# Altium integrated library LEMO Unipole And Multipole Type Connectors.IntLib: 1566 symbols (part 10 of 13) (continued)
## PKC.M0.8GL.NN (continued)
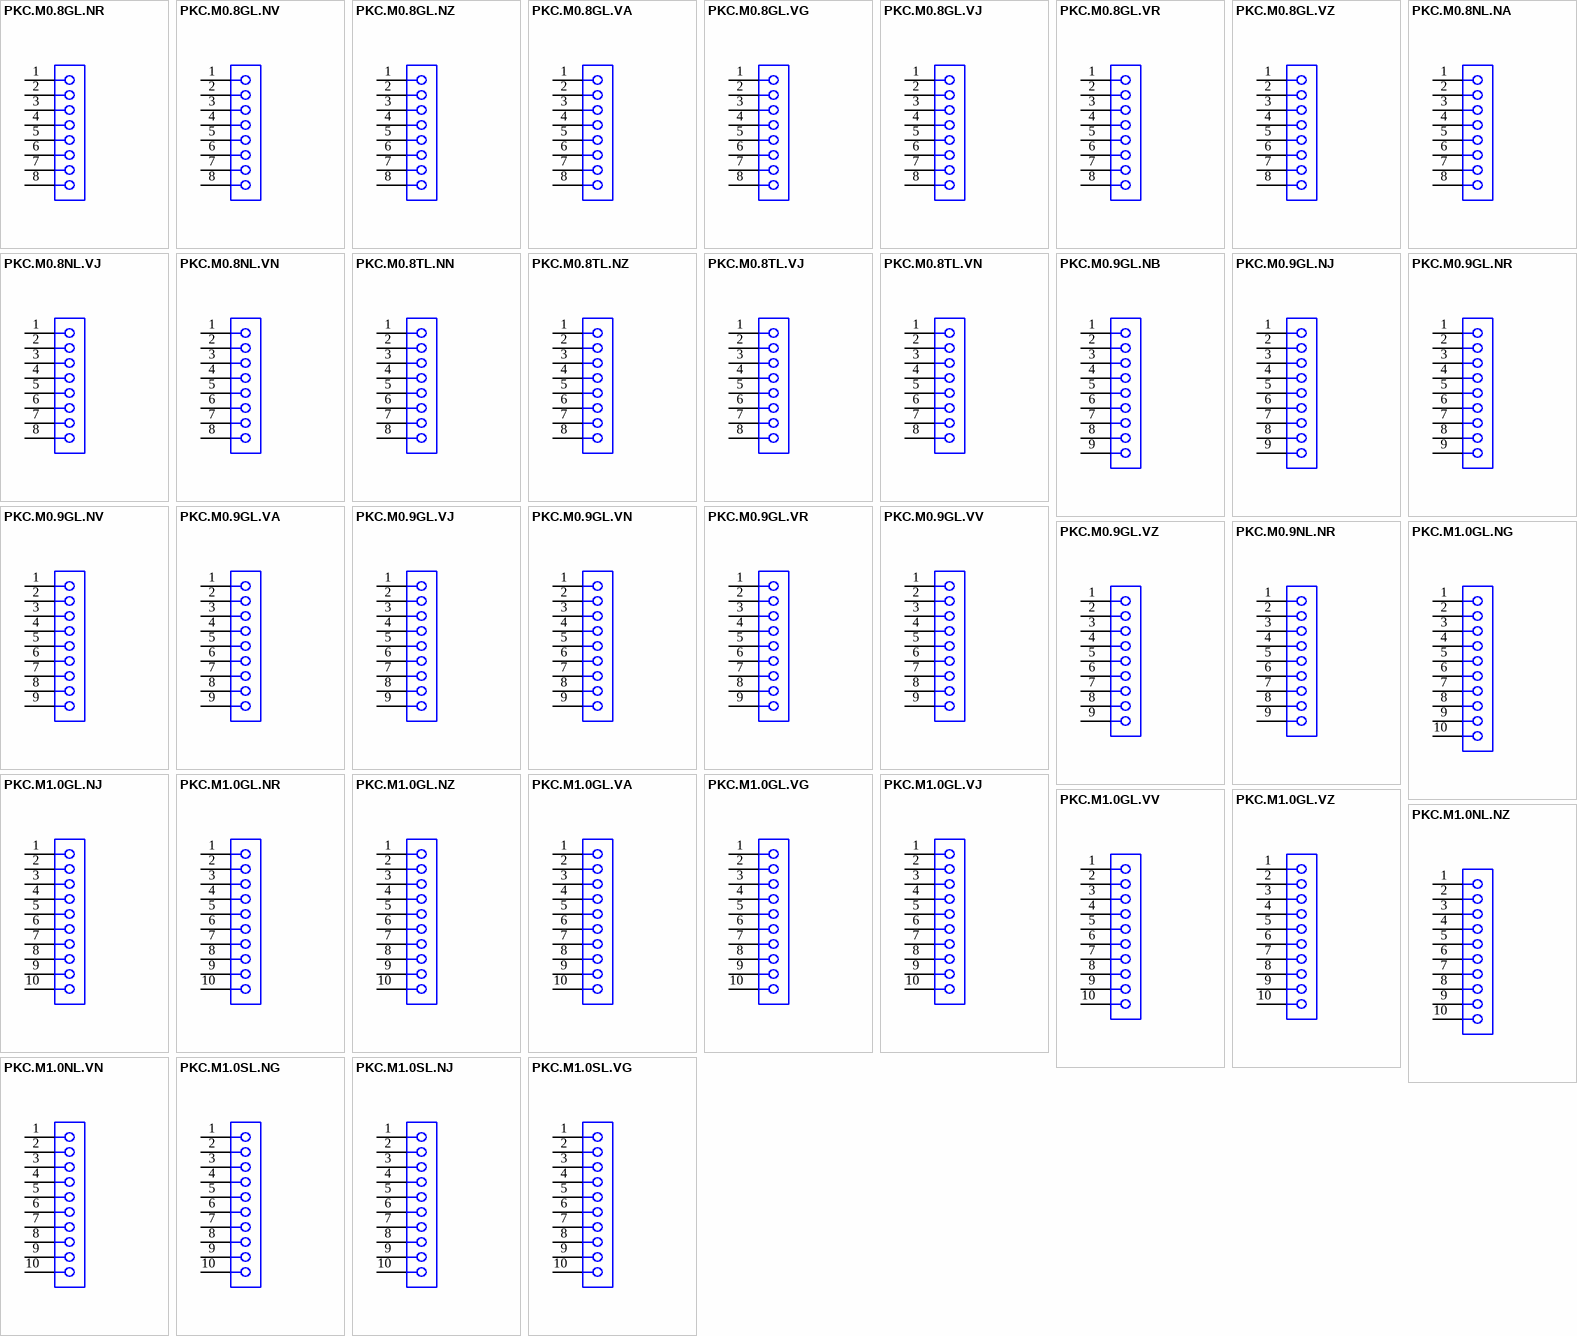
[diagram p32: symbols PKC.M0.8GL.NR to PKC.M1.0SL.VG]

## PKC.M0.8GL.NR
designator J?
Fixed receptacle with two nuts (back panel mounting), straight print contacts, Key (C), P series, Multipole Type with 8 Contacts; Manufacturer: LEMO; PartNumber: PKC.M0.8GL.NR; Number of contacts: 8; Contact Diameter: 0.7 mm; Test voltage (kV rms) Contact-Contact: 1.05; Rated Current(A): 5; DatasheetVersion: Jun-14; PackageReference: PKC.M0.8GL.NR; PackageDescription: Fixed receptacle with two nuts (back panel mounting), straight print contacts, Key(C) for Printed Circuit; ComponentLink1Description: Manufacturer URL; ComponentLink1URL: http://www.lemo.com; ComponentLink2Description: Datasheet; ComponentLink2URL: http://intra.lemo.ch/catalog/ROW/UK_English/P_series_catalog.pdf
footprint PKC.M0.8GL.NR (Socket, Female, Height 33.5 mm, Through hole)
pins: 1, 2, 3, 4, 5, 6, 7, 8

## PKC.M0.8GL.NV
designator J?
Fixed receptacle with two nuts (back panel mounting), straight print contacts, Key (C), P series, Multipole Type with 8 Contacts; Manufacturer: LEMO; PartNumber: PKC.M0.8GL.NV; Number of contacts: 8; Contact Diameter: 0.7 mm; Test voltage (kV rms) Contact-Contact: 1.05; Rated Current(A): 5; DatasheetVersion: Jun-14; PackageReference: PKC.M0.8GL.NV; PackageDescription: Fixed receptacle with two nuts (back panel mounting), straight print contacts, Key(C) for Printed Circuit; ComponentLink1Description: Manufacturer URL; ComponentLink1URL: http://www.lemo.com; ComponentLink2Description: Datasheet; ComponentLink2URL: http://intra.lemo.ch/catalog/ROW/UK_English/P_series_catalog.pdf
footprint PKC.M0.8GL.NV (Socket, Female, Height 33.5 mm, Through hole)
pins: 1, 2, 3, 4, 5, 6, 7, 8

## PKC.M0.8GL.NZ
designator J?
Fixed receptacle with 1 nut (without 2nd front nut), Key (C), P series, Multipole Type with 8 Contacts; Manufacturer: LEMO; PartNumber: PKC.M0.8GL.NZ; Number of contacts: 8; Contact Diameter: 0.7 mm; Test voltage (kV rms) Contact-Contact: 1.05; Rated Current(A): 5; DatasheetVersion: Jun-14; PackageReference: PKC.M0.8GL.NZ; PackageDescription: Fixed receptacle with 1 nut (without 2nd front nut), Key(C) for Printed Circuit; ComponentLink1Description: Manufacturer URL; ComponentLink1URL: http://www.lemo.com; ComponentLink2Description: Datasheet; ComponentLink2URL: http://intra.lemo.ch/catalog/ROW/UK_English/P_series_catalog.pdf
footprint PKC.M0.8GL.NZ (Socket, Female, Height 25 mm, Through hole)
pins: 1, 2, 3, 4, 5, 6, 7, 8

## PKC.M0.8GL.VA
designator J?
Fixed receptacle with two nuts (back panel mounting), 90° print contacts, Key (C), P series, Multipole Type with 8 Contacts; Manufacturer: LEMO; PartNumber: PKC.M0.8GL.VA; Number of contacts: 8; Contact Diameter: 0.7 mm; Test voltage (kV rms) Contact-Contact: 1.05; Rated Current(A): 5; DatasheetVersion: Jun-14; PackageReference: PKC.M0.8GL.VA; PackageDescription: Fixed receptacle with two nuts (back panel mounting), 90° print contacts, Key(C) for Printed Circuit; ComponentLink1Description: Manufacturer URL; ComponentLink1URL: http://www.lemo.com; ComponentLink2Description: Datasheet; ComponentLink2URL: http://intra.lemo.ch/catalog/ROW/UK_English/P_series_catalog.pdf
footprint PKC.M0.8GL.VA (Socket, Female, Height 33.5 mm, Through hole)
pins: 1, 2, 3, 4, 5, 6, 7, 8

## PKC.M0.8GL.VG
designator J?
Fixed receptacle with two nuts (back panel mounting), 90° print contacts, Key (C), P series, Multipole Type with 8 Contacts; Manufacturer: LEMO; PartNumber: PKC.M0.8GL.VG; Number of contacts: 8; Contact Diameter: 0.7 mm; Test voltage (kV rms) Contact-Contact: 1.05; Rated Current(A): 5; DatasheetVersion: Jun-14; PackageReference: PKC.M0.8GL.VG; PackageDescription: Fixed receptacle with two nuts (back panel mounting), 90° print contacts, Key(C) for Printed Circuit; ComponentLink1Description: Manufacturer URL; ComponentLink1URL: http://www.lemo.com; ComponentLink2Description: Datasheet; ComponentLink2URL: http://intra.lemo.ch/catalog/ROW/UK_English/P_series_catalog.pdf
footprint PKC.M0.8GL.VG (Socket, Female, Height 33.5 mm, Through hole)
pins: 1, 2, 3, 4, 5, 6, 7, 8

## PKC.M0.8GL.VJ
designator J?
Fixed receptacle with two nuts (back panel mounting), 90° print contacts, Key (C), P series, Multipole Type with 8 Contacts; Manufacturer: LEMO; PartNumber: PKC.M0.8GL.VJ; Number of contacts: 8; Contact Diameter: 0.7 mm; Test voltage (kV rms) Contact-Contact: 1.05; Rated Current(A): 5; DatasheetVersion: Jun-14; PackageReference: PKC.M0.8GL.VJ; PackageDescription: Fixed receptacle with two nuts (back panel mounting), 90° print contacts, Key(C) for Printed Circuit; ComponentLink1Description: Manufacturer URL; ComponentLink1URL: http://www.lemo.com; ComponentLink2Description: Datasheet; ComponentLink2URL: http://intra.lemo.ch/catalog/ROW/UK_English/P_series_catalog.pdf
footprint PKC.M0.8GL.VJ (Socket, Female, Height 33.5 mm, Through hole)
pins: 1, 2, 3, 4, 5, 6, 7, 8

## PKC.M0.8GL.VR
designator J?
Fixed receptacle with two nuts (back panel mounting), 90° print contacts, Key (C), P series, Multipole Type with 8 Contacts; Manufacturer: LEMO; PartNumber: PKC.M0.8GL.VR; Number of contacts: 8; Contact Diameter: 0.7 mm; Test voltage (kV rms) Contact-Contact: 1.05; Rated Current(A): 5; DatasheetVersion: Jun-14; PackageReference: PKC.M0.8GL.VR; PackageDescription: Fixed receptacle with two nuts (back panel mounting), 90° print contacts, Key(C) for Printed Circuit; ComponentLink1Description: Manufacturer URL; ComponentLink1URL: http://www.lemo.com; ComponentLink2Description: Datasheet; ComponentLink2URL: http://intra.lemo.ch/catalog/ROW/UK_English/P_series_catalog.pdf
footprint PKC.M0.8GL.VR (Socket, Female, Height 33.5 mm, Through hole)
pins: 1, 2, 3, 4, 5, 6, 7, 8

## PKC.M0.8GL.VZ
designator J?
Fixed receptacle with 1 nut (without 2nd front nut), Key (C), P series, Multipole Type with 8 Contacts; Manufacturer: LEMO; PartNumber: PKC.M0.8GL.VZ; Number of contacts: 8; Contact Diameter: 0.7 mm; Test voltage (kV rms) Contact-Contact: 1.05; Rated Current(A): 5; DatasheetVersion: Jun-14; PackageReference: PKC.M0.8GL.VZ; PackageDescription: Fixed receptacle with 1 nut (without 2nd front nut), Key(C) for Printed Circuit; ComponentLink1Description: Manufacturer URL; ComponentLink1URL: http://www.lemo.com; ComponentLink2Description: Datasheet; ComponentLink2URL: http://intra.lemo.ch/catalog/ROW/UK_English/P_series_catalog.pdf
footprint PKC.M0.8GL.VZ (Socket, Female, Height 33.5 mm, Through hole)
pins: 1, 2, 3, 4, 5, 6, 7, 8

## PKC.M0.8NL.NA
designator J?
Fixed receptacle with two nuts (back panel mounting), straight print contacts, Key (C), P series, Multipole Type with 8 Contacts; Manufacturer: LEMO; PartNumber: PKC.M0.8NL.NA; Number of contacts: 8; Contact Diameter: 0.7 mm; Test voltage (kV rms) Contact-Contact: 1.05; Rated Current(A): 5; DatasheetVersion: Jun-14; PackageReference: PKC.M0.8NL.NA; PackageDescription: Fixed receptacle with two nuts (back panel mounting), straight print contacts, Key(C) for Printed Circuit; ComponentLink1Description: Manufacturer URL; ComponentLink1URL: http://www.lemo.com; ComponentLink2Description: Datasheet; ComponentLink2URL: http://intra.lemo.ch/catalog/ROW/UK_English/P_series_catalog.pdf
footprint PKC.M0.8NL.NA (Socket, Female, Height 33.5 mm, Through hole)
pins: 1, 2, 3, 4, 5, 6, 7, 8

## PKC.M0.8NL.VJ
designator J?
Fixed receptacle with two nuts (back panel mounting), 90° print contacts, Key (C), P series, Multipole Type with 8 Contacts; Manufacturer: LEMO; PartNumber: PKC.M0.8NL.VJ; Number of contacts: 8; Contact Diameter: 0.7 mm; Test voltage (kV rms) Contact-Contact: 1.05; Rated Current(A): 5; DatasheetVersion: Jun-14; PackageReference: PKC.M0.8NL.VJ; PackageDescription: Fixed receptacle with two nuts (back panel mounting), 90° print contacts, Key(C) for Printed Circuit; ComponentLink1Description: Manufacturer URL; ComponentLink1URL: http://www.lemo.com; ComponentLink2Description: Datasheet; ComponentLink2URL: http://intra.lemo.ch/catalog/ROW/UK_English/P_series_catalog.pdf
footprint PKC.M0.8NL.VJ (Socket, Female, Height 33.5 mm, Through hole)
pins: 1, 2, 3, 4, 5, 6, 7, 8

## PKC.M0.8NL.VN
designator J?
Fixed receptacle with two nuts (back panel mounting), 90° print contacts, Key (C), P series, Multipole Type with 8 Contacts; Manufacturer: LEMO; PartNumber: PKC.M0.8NL.VN; Number of contacts: 8; Contact Diameter: 0.7 mm; Test voltage (kV rms) Contact-Contact: 1.05; Rated Current(A): 5; DatasheetVersion: Jun-14; PackageReference: PKC.M0.8NL.VN; PackageDescription: Fixed receptacle with two nuts (back panel mounting), 90° print contacts, Key(C) for Printed Circuit; ComponentLink1Description: Manufacturer URL; ComponentLink1URL: http://www.lemo.com; ComponentLink2Description: Datasheet; ComponentLink2URL: http://intra.lemo.ch/catalog/ROW/UK_English/P_series_catalog.pdf
footprint PKC.M0.8NL.VN (Socket, Female, Height 33.5 mm, Through hole)
pins: 1, 2, 3, 4, 5, 6, 7, 8

## PKC.M0.8TL.NN
designator J?
Fixed receptacle with two nuts (back panel mounting), straight print contacts, Key (C), P series, Multipole Type with 8 Contacts; Manufacturer: LEMO; PartNumber: PKC.M0.8TL.NN; Number of contacts: 8; Contact Diameter: 0.7 mm; Test voltage (kV rms) Contact-Contact: 1.05; Rated Current(A): 5; DatasheetVersion: Jun-14; PackageReference: PKC.M0.8TL.NN; PackageDescription: Fixed receptacle with two nuts (back panel mounting), straight print contacts, Key(C) for Printed Circuit; Supplier 1: Mouser; Supplier Part Number 1: 736-PKCM08TLNN; Supplier 2: Digi-Key; Supplier Part Number 2: PKC.M0.8TL.NN-ND; ComponentLink1Description: Manufacturer URL; ComponentLink1URL: http://www.lemo.com; ComponentLink2Description: Datasheet; ComponentLink2URL: http://intra.lemo.ch/catalog/ROW/UK_English/P_series_catalog.pdf
footprint PKC.M0.8TL.NN (Socket, Female, Height 33.5 mm, Through hole)
pins: 1, 2, 3, 4, 5, 6, 7, 8

## PKC.M0.8TL.NZ
designator J?
Fixed receptacle with 1 nut (without 2nd front nut), Key (C), P series, Multipole Type with 8 Contacts; Manufacturer: LEMO; PartNumber: PKC.M0.8TL.NZ; Number of contacts: 8; Contact Diameter: 0.7 mm; Test voltage (kV rms) Contact-Contact: 1.05; Rated Current(A): 5; DatasheetVersion: Jun-14; PackageReference: PKC.M0.8TL.NZ; PackageDescription: Fixed receptacle with 1 nut (without 2nd front nut), Key(C) for Printed Circuit; Supplier 1: Mouser; Supplier Part Number 1: 736-PKCM08TLNZ; Supplier 2: Digi-Key; Supplier Part Number 2: PKC.M0.8TL.NZ-ND; ComponentLink1Description: Manufacturer URL; ComponentLink1URL: http://www.lemo.com; ComponentLink2Description: Datasheet; ComponentLink2URL: http://intra.lemo.ch/catalog/ROW/UK_English/P_series_catalog.pdf
footprint PKC.M0.8TL.NZ (Socket, Female, Height 25 mm, Through hole)
pins: 1, 2, 3, 4, 5, 6, 7, 8

## PKC.M0.8TL.VJ
designator J?
Fixed receptacle with two nuts (back panel mounting), 90° print contacts, Key (C), P series, Multipole Type with 8 Contacts; Manufacturer: LEMO; PartNumber: PKC.M0.8TL.VJ; Number of contacts: 8; Contact Diameter: 0.7 mm; Test voltage (kV rms) Contact-Contact: 1.05; Rated Current(A): 5; DatasheetVersion: Jun-14; PackageReference: PKC.M0.8TL.VJ; PackageDescription: Fixed receptacle with two nuts (back panel mounting), 90° print contacts, Key(C) for Printed Circuit; Supplier 1: Mouser; Supplier Part Number 1: 736-PKCM08TLVJ; Supplier 2: Digi-Key; Supplier Part Number 2: PKC.M0.8TL.VJ-ND; ComponentLink1Description: Manufacturer URL; ComponentLink1URL: http://www.lemo.com; ComponentLink2Description: Datasheet; ComponentLink2URL: http://intra.lemo.ch/catalog/ROW/UK_English/P_series_catalog.pdf
footprint PKC.M0.8TL.VJ (Socket, Female, Height 33.5 mm, Through hole)
pins: 1, 2, 3, 4, 5, 6, 7, 8

## PKC.M0.8TL.VN
designator J?
Fixed receptacle with two nuts (back panel mounting), 90° print contacts, Key (C), P series, Multipole Type with 8 Contacts; Manufacturer: LEMO; PartNumber: PKC.M0.8TL.VN; Number of contacts: 8; Contact Diameter: 0.7 mm; Test voltage (kV rms) Contact-Contact: 1.05; Rated Current(A): 5; DatasheetVersion: Jun-14; PackageReference: PKC.M0.8TL.VN; PackageDescription: Fixed receptacle with two nuts (back panel mounting), 90° print contacts, Key(C) for Printed Circuit; Supplier 1: Mouser; Supplier Part Number 1: 736-PKCM08TLVN; Supplier 2: Digi-Key; Supplier Part Number 2: PKC.M0.8TL.VN-ND; ComponentLink1Description: Manufacturer URL; ComponentLink1URL: http://www.lemo.com; ComponentLink2Description: Datasheet; ComponentLink2URL: http://intra.lemo.ch/catalog/ROW/UK_English/P_series_catalog.pdf
footprint PKC.M0.8TL.VN (Socket, Female, Height 33.5 mm, Through hole)
pins: 1, 2, 3, 4, 5, 6, 7, 8

## PKC.M0.9GL.NB
designator J?
Fixed receptacle with two nuts (back panel mounting), straight print contacts, Key (C), P series, Multipole Type with 9 Contacts; Manufacturer: LEMO; PartNumber: PKC.M0.9GL.NB; Number of contacts: 9; Contact Diameter: 0.5 mm; Test voltage (kV rms) Contact-Contact: 0.85; Rated Current(A): 3; DatasheetVersion: Jun-14; PackageReference: PKC.M0.9GL.NB; PackageDescription: Fixed receptacle with two nuts (back panel mounting), straight print contacts, Key(C) for Printed Circuit; ComponentLink1Description: Manufacturer URL; ComponentLink1URL: http://www.lemo.com; ComponentLink2Description: Datasheet; ComponentLink2URL: http://intra.lemo.ch/catalog/ROW/UK_English/P_series_catalog.pdf
footprint PKC.M0.9GL.NB (Socket, Female, Height 33.5 mm, Through hole)
pins: 1, 2, 3, 4, 5, 6, 7, 8, 9

## PKC.M0.9GL.NJ
designator J?
Fixed receptacle with two nuts (back panel mounting), straight print contacts, Key (C), P series, Multipole Type with 9 Contacts; Manufacturer: LEMO; PartNumber: PKC.M0.9GL.NJ; Number of contacts: 9; Contact Diameter: 0.5 mm; Test voltage (kV rms) Contact-Contact: 0.85; Rated Current(A): 3; DatasheetVersion: Jun-14; PackageReference: PKC.M0.9GL.NJ; PackageDescription: Fixed receptacle with two nuts (back panel mounting), straight print contacts, Key(C) for Printed Circuit; ComponentLink1Description: Manufacturer URL; ComponentLink1URL: http://www.lemo.com; ComponentLink2Description: Datasheet; ComponentLink2URL: http://intra.lemo.ch/catalog/ROW/UK_English/P_series_catalog.pdf
footprint PKC.M0.9GL.NJ (Socket, Female, Height 33.5 mm, Through hole)
pins: 1, 2, 3, 4, 5, 6, 7, 8, 9

## PKC.M0.9GL.NR
designator J?
Fixed receptacle with two nuts (back panel mounting), straight print contacts, Key (C), P series, Multipole Type with 9 Contacts; Manufacturer: LEMO; PartNumber: PKC.M0.9GL.NR; Number of contacts: 9; Contact Diameter: 0.5 mm; Test voltage (kV rms) Contact-Contact: 0.85; Rated Current(A): 3; DatasheetVersion: Jun-14; PackageReference: PKC.M0.9GL.NR; PackageDescription: Fixed receptacle with two nuts (back panel mounting), straight print contacts, Key(C) for Printed Circuit; ComponentLink1Description: Manufacturer URL; ComponentLink1URL: http://www.lemo.com; ComponentLink2Description: Datasheet; ComponentLink2URL: http://intra.lemo.ch/catalog/ROW/UK_English/P_series_catalog.pdf
footprint PKC.M0.9GL.NR (Socket, Female, Height 33.5 mm, Through hole)
pins: 1, 2, 3, 4, 5, 6, 7, 8, 9

## PKC.M0.9GL.NV
designator J?
Fixed receptacle with two nuts (back panel mounting), straight print contacts, Key (C), P series, Multipole Type with 9 Contacts; Manufacturer: LEMO; PartNumber: PKC.M0.9GL.NV; Number of contacts: 9; Contact Diameter: 0.5 mm; Test voltage (kV rms) Contact-Contact: 0.85; Rated Current(A): 3; DatasheetVersion: Jun-14; PackageReference: PKC.M0.9GL.NV; PackageDescription: Fixed receptacle with two nuts (back panel mounting), straight print contacts, Key(C) for Printed Circuit; ComponentLink1Description: Manufacturer URL; ComponentLink1URL: http://www.lemo.com; ComponentLink2Description: Datasheet; ComponentLink2URL: http://intra.lemo.ch/catalog/ROW/UK_English/P_series_catalog.pdf
footprint PKC.M0.9GL.NV (Socket, Female, Height 33.5 mm, Through hole)
pins: 1, 2, 3, 4, 5, 6, 7, 8, 9

## PKC.M0.9GL.VA
designator J?
Fixed receptacle with two nuts (back panel mounting), 90° print contacts, Key (C), P series, Multipole Type with 9 Contacts; Manufacturer: LEMO; PartNumber: PKC.M0.9GL.VA; Number of contacts: 9; Contact Diameter: 0.5 mm; Test voltage (kV rms) Contact-Contact: 0.85; Rated Current(A): 3; DatasheetVersion: Jun-14; PackageReference: PKC.M0.9GL.VA; PackageDescription: Fixed receptacle with two nuts (back panel mounting), 90° print contacts, Key(C) for Printed Circuit; ComponentLink1Description: Manufacturer URL; ComponentLink1URL: http://www.lemo.com; ComponentLink2Description: Datasheet; ComponentLink2URL: http://intra.lemo.ch/catalog/ROW/UK_English/P_series_catalog.pdf
footprint PKC.M0.9GL.VA (Socket, Female, Height 33.5 mm, Through hole)
pins: 1, 2, 3, 4, 5, 6, 7, 8, 9

## PKC.M0.9GL.VJ
designator J?
Fixed receptacle with two nuts (back panel mounting), 90° print contacts, Key (C), P series, Multipole Type with 9 Contacts; Manufacturer: LEMO; PartNumber: PKC.M0.9GL.VJ; Number of contacts: 9; Contact Diameter: 0.5 mm; Test voltage (kV rms) Contact-Contact: 0.85; Rated Current(A): 3; DatasheetVersion: Jun-14; PackageReference: PKC.M0.9GL.VJ; PackageDescription: Fixed receptacle with two nuts (back panel mounting), 90° print contacts, Key(C) for Printed Circuit; ComponentLink1Description: Manufacturer URL; ComponentLink1URL: http://www.lemo.com; ComponentLink2Description: Datasheet; ComponentLink2URL: http://intra.lemo.ch/catalog/ROW/UK_English/P_series_catalog.pdf
footprint PKC.M0.9GL.VJ (Socket, Female, Height 33.5 mm, Through hole)
pins: 1, 2, 3, 4, 5, 6, 7, 8, 9

## PKC.M0.9GL.VN
designator J?
Fixed receptacle with two nuts (back panel mounting), 90° print contacts, Key (C), P series, Multipole Type with 9 Contacts; Manufacturer: LEMO; PartNumber: PKC.M0.9GL.VN; Number of contacts: 9; Contact Diameter: 0.5 mm; Test voltage (kV rms) Contact-Contact: 0.85; Rated Current(A): 3; DatasheetVersion: Jun-14; PackageReference: PKC.M0.9GL.VN; PackageDescription: Fixed receptacle with two nuts (back panel mounting), 90° print contacts, Key(C) for Printed Circuit; ComponentLink1Description: Manufacturer URL; ComponentLink1URL: http://www.lemo.com; ComponentLink2Description: Datasheet; ComponentLink2URL: http://intra.lemo.ch/catalog/ROW/UK_English/P_series_catalog.pdf
footprint PKC.M0.9GL.VN (Socket, Female, Height 33.5 mm, Through hole)
pins: 1, 2, 3, 4, 5, 6, 7, 8, 9

## PKC.M0.9GL.VR
designator J?
Fixed receptacle with two nuts (back panel mounting), 90° print contacts, Key (C),  series, Multipole Type with 9 Contacts; Manufacturer: LEMO; PartNumber: PKC.M0.9GL.VR; Number of contacts: 9; Contact Diameter: 0.5 mm; Test voltage (kV rms) Contact-Contact: 0.85; Rated Current(A): 3; DatasheetVersion: Jun-14; PackageReference: PKC.M0.9GL.VR; PackageDescription: Fixed receptacle with two nuts (back panel mounting), 90° print contacts, Key(C) for Printed Circuit; ComponentLink1Description: Manufacturer URL; ComponentLink1URL: http://www.lemo.com; ComponentLink2Description: Datasheet; ComponentLink2URL: http://intra.lemo.ch/catalog/ROW/UK_English/P_series_catalog.pdf
footprint PKC.M0.9GL.VR (Socket, Female, Height 33.5 mm, Through hole)
pins: 1, 2, 3, 4, 5, 6, 7, 8, 9

## PKC.M0.9GL.VV
designator J?
Fixed receptacle with two nuts (back panel mounting), 90° print contacts, Key (C), P series, Multipole Type with 9 Contacts; Manufacturer: LEMO; PartNumber: PKC.M0.9GL.VV; Number of contacts: 9; Contact Diameter: 0.5 mm; Test voltage (kV rms) Contact-Contact: 0.85; Rated Current(A): 3; DatasheetVersion: Jun-14; PackageReference: PKC.M0.9GL.VV; PackageDescription: Fixed receptacle with two nuts (back panel mounting), 90° print contacts, Key(C) for Printed Circuit; ComponentLink1Description: Manufacturer URL; ComponentLink1URL: http://www.lemo.com; ComponentLink2Description: Datasheet; ComponentLink2URL: http://intra.lemo.ch/catalog/ROW/UK_English/P_series_catalog.pdf
footprint PKC.M0.9GL.VV (Socket, Female, Through hole)
pins: 1, 2, 3, 4, 5, 6, 7, 8, 9

## PKC.M0.9GL.VZ
designator J?
Fixed receptacle with 1 nut (without 2nd front nut), Key (C), P series, Multipole Type with 9 Contacts; Manufacturer: LEMO; PartNumber: PKC.M0.9GL.VZ; Number of contacts: 9; Contact Diameter: 0.5 mm; Test voltage (kV rms) Contact-Contact: 0.85; Rated Current(A): 3; DatasheetVersion: Jun-14; PackageReference: PKC.M0.9GL.VZ; PackageDescription: Fixed receptacle with 1 nut (without 2nd front nut), Key(C) for Printed Circuit; ComponentLink1Description: Manufacturer URL; ComponentLink1URL: http://www.lemo.com; ComponentLink2Description: Datasheet; ComponentLink2URL: http://intra.lemo.ch/catalog/ROW/UK_English/P_series_catalog.pdf
footprint PKC.M0.9GL.VZ (Socket, Female, Height 33.5 mm, Through hole)
pins: 1, 2, 3, 4, 5, 6, 7, 8, 9

## PKC.M0.9NL.NR
designator J?
Fixed receptacle with two nuts (back panel mounting), straight print contacts, Key (C), P series, Multipole Type with 9 Contacts; Manufacturer: LEMO; PartNumber: PKC.M0.9NL.NR; Number of contacts: 9; Contact Diameter: 0.5 mm; Test voltage (kV rms) Contact-Contact: 0.85; Rated Current(A): 3; DatasheetVersion: Jun-14; PackageReference: PKC.M0.9NL.NR; PackageDescription: Fixed receptacle with two nuts (back panel mounting), straight print contacts, Key(C) for Printed Circuit; ComponentLink1Description: Manufacturer URL; ComponentLink1URL: http://www.lemo.com; ComponentLink2Description: Datasheet; ComponentLink2URL: http://intra.lemo.ch/catalog/ROW/UK_English/P_series_catalog.pdf
footprint PKC.M0.9NL.NR (Socket, Female, Height 33.5 mm, Through hole)
pins: 1, 2, 3, 4, 5, 6, 7, 8, 9

## PKC.M1.0GL.NG
designator J?
Fixed receptacle with two nuts (back panel mounting), straight print contacts, Key (C), P series, Multipole Type with 10 Contacts; Manufacturer: LEMO; PartNumber: PKC.M1.0GL.NG; Number of contacts: 10; Contact Diameter: 0.5 mm; Test voltage (kV rms) Contact-Contact: 0.85; Rated Current(A): 3; DatasheetVersion: Jun-14; PackageReference: PKC.M1.0GL.NG; PackageDescription: Fixed receptacle with two nuts (back panel mounting), straight print contacts, Key(C) for Printed Circuit; ComponentLink1Description: Manufacturer URL; ComponentLink1URL: http://www.lemo.com; ComponentLink2Description: Datasheet; ComponentLink2URL: http://intra.lemo.ch/catalog/ROW/UK_English/P_series_catalog.pdf
footprint PKC.M1.0GL.NG (Socket, Female, Height 33.5 mm, Through hole)
pins: 1, 2, 3, 4, 5, 6, 7, 8, 9, 10

## PKC.M1.0GL.NJ
designator J?
Fixed receptacle with two nuts (back panel mounting), straight print contacts, Key (C), P series, Multipole Type with 10 Contacts; Manufacturer: LEMO; PartNumber: PKC.M1.0GL.NJ; Number of contacts: 10; Contact Diameter: 0.5 mm; Test voltage (kV rms) Contact-Contact: 0.85; Rated Current(A): 3; DatasheetVersion: Jun-14; PackageReference: PKC.M1.0GL.NJ; PackageDescription: Fixed receptacle with two nuts (back panel mounting), straight print contacts, Key(C) for Printed Circuit; Supplier 1: Mouser; Supplier Part Number 1: 736-PKCM10GLNJ; Supplier 2: Digi-Key; Supplier Part Number 2: PKC.M1.0GL.NJ-ND; ComponentLink1Description: Manufacturer URL; ComponentLink1URL: http://www.lemo.com; ComponentLink2Description: Datasheet; ComponentLink2URL: http://intra.lemo.ch/catalog/ROW/UK_English/P_series_catalog.pdf
footprint PKC.M1.0GL.NJ (Socket, Female, Height 33.5 mm, Through hole)
pins: 1, 2, 3, 4, 5, 6, 7, 8, 9, 10

## PKC.M1.0GL.NR
designator J?
Fixed receptacle with two nuts (back panel mounting), straight print contacts, Key (C), P series, Multipole Type with 10 Contacts; Manufacturer: LEMO; PartNumber: PKC.M1.0GL.NR; Number of contacts: 10; Contact Diameter: 0.5 mm; Test voltage (kV rms) Contact-Contact: 0.85; Rated Current(A): 3; DatasheetVersion: Jun-14; PackageReference: PKC.M1.0GL.NR; PackageDescription: Fixed receptacle with two nuts (back panel mounting), straight print contacts, Key(C) for Printed Circuit; ComponentLink1Description: Manufacturer URL; ComponentLink1URL: http://www.lemo.com; ComponentLink2Description: Datasheet; ComponentLink2URL: http://intra.lemo.ch/catalog/ROW/UK_English/P_series_catalog.pdf
footprint PKC.M1.0GL.NR (Socket, Female, Height 33.5 mm, Through hole)
pins: 1, 2, 3, 4, 5, 6, 7, 8, 9, 10

## PKC.M1.0GL.NZ
designator J?
Fixed receptacle with 1 nut (without 2nd front nut), Key (C), P series, Multipole Type with 10 Contacts; Manufacturer: LEMO; PartNumber: PKC.M1.0GL.NZ; Number of contacts: 10; Contact Diameter: 0.5 mm; Test voltage (kV rms) Contact-Contact: 0.85; Rated Current(A): 3; DatasheetVersion: Jun-14; PackageReference: PKC.M1.0GL.NZ; PackageDescription: Fixed receptacle with 1 nut (without 2nd front nut), Key(C) for Printed Circuit; ComponentLink1Description: Manufacturer URL; ComponentLink1URL: http://www.lemo.com; ComponentLink2Description: Datasheet; ComponentLink2URL: http://intra.lemo.ch/catalog/ROW/UK_English/P_series_catalog.pdf
footprint PKC.M1.0GL.NZ (Socket, Female, Height 25 mm, Through hole)
pins: 1, 2, 3, 4, 5, 6, 7, 8, 9, 10

## PKC.M1.0GL.VA
designator J?
Fixed receptacle with two nuts (back panel mounting), 90° print contacts, Key (C),  series, Multipole Type with 10 Contacts; Manufacturer: LEMO; PartNumber: PKC.M1.0GL.VA; Number of contacts: 10; Contact Diameter: 0.5 mm; Test voltage (kV rms) Contact-Contact: 0.85; Rated Current(A): 3; DatasheetVersion: Jun-14; PackageReference: PKC.M1.0GL.VA; PackageDescription: Fixed receptacle with two nuts (back panel mounting), 90° print contacts, Key(C) for Printed Circuit; ComponentLink1Description: Manufacturer URL; ComponentLink1URL: http://www.lemo.com; ComponentLink2Description: Datasheet; ComponentLink2URL: http://intra.lemo.ch/catalog/ROW/UK_English/P_series_catalog.pdf
footprint PKC.M1.0GL.VA (Socket, Female, Height 33.5 mm, Through hole)
pins: 1, 2, 3, 4, 5, 6, 7, 8, 9, 10

## PKC.M1.0GL.VG
designator J?
Fixed receptacle with two nuts (back panel mounting), 90° print contacts, Key (C), P series, Multipole Type with 10 Contacts; Manufacturer: LEMO; PartNumber: PKC.M1.0GL.VG; Number of contacts: 10; Contact Diameter: 0.5 mm; Test voltage (kV rms) Contact-Contact: 0.85; Rated Current(A): 3; DatasheetVersion: Jun-14; PackageReference: PKC.M1.0GL.VG; PackageDescription: Fixed receptacle with two nuts (back panel mounting), 90° print contacts, Key(C) for Printed Circuit; Supplier 1: Mouser; Supplier Part Number 1: 736-PKCM10GLVG; Supplier 2: Digi-Key; Supplier Part Number 2: PKC.M1.0GL.VG-ND; ComponentLink1Description: Manufacturer URL; ComponentLink1URL: http://www.lemo.com; ComponentLink2Description: Datasheet; ComponentLink2URL: http://intra.lemo.ch/catalog/ROW/UK_English/P_series_catalog.pdf
footprint PKC.M1.0GL.VG (Socket, Female, Height 33.5 mm, Through hole)
pins: 1, 2, 3, 4, 5, 6, 7, 8, 9, 10

## PKC.M1.0GL.VJ
designator J?
Fixed receptacle with two nuts (back panel mounting), 90° print contacts, Key (C), P series, Multipole Type with 10 Contacts; Manufacturer: LEMO; PartNumber: PKC.M1.0GL.VJ; Number of contacts: 10; Contact Diameter: 0.5 mm; Test voltage (kV rms) Contact-Contact: 0.85; Rated Current(A): 3; DatasheetVersion: Jun-14; PackageReference: PKC.M1.0GL.VJ; PackageDescription: Fixed receptacle with two nuts (back panel mounting), 90° print contacts, Key(C) for Printed Circuit; ComponentLink1Description: Manufacturer URL; ComponentLink1URL: http://www.lemo.com; ComponentLink2Description: Datasheet; ComponentLink2URL: http://intra.lemo.ch/catalog/ROW/UK_English/P_series_catalog.pdf
footprint PKC.M1.0GL.VJ (Socket, Female, Height 33.5 mm, Through hole)
pins: 1, 2, 3, 4, 5, 6, 7, 8, 9, 10
